# Altium footprint library mastermind.PCBLIB: 1061 footprints (part 43 of 67)
Each footprint in its own frame and in the unit in brackets; x right, y up, seen from the top. Pads: shape width x height; smd on the part's side, far side on the other; paste and mask are expansions set on the pad; w line width, h text height; cw(c..) or ccw(c..) is an arc to the next point about the centre after c.
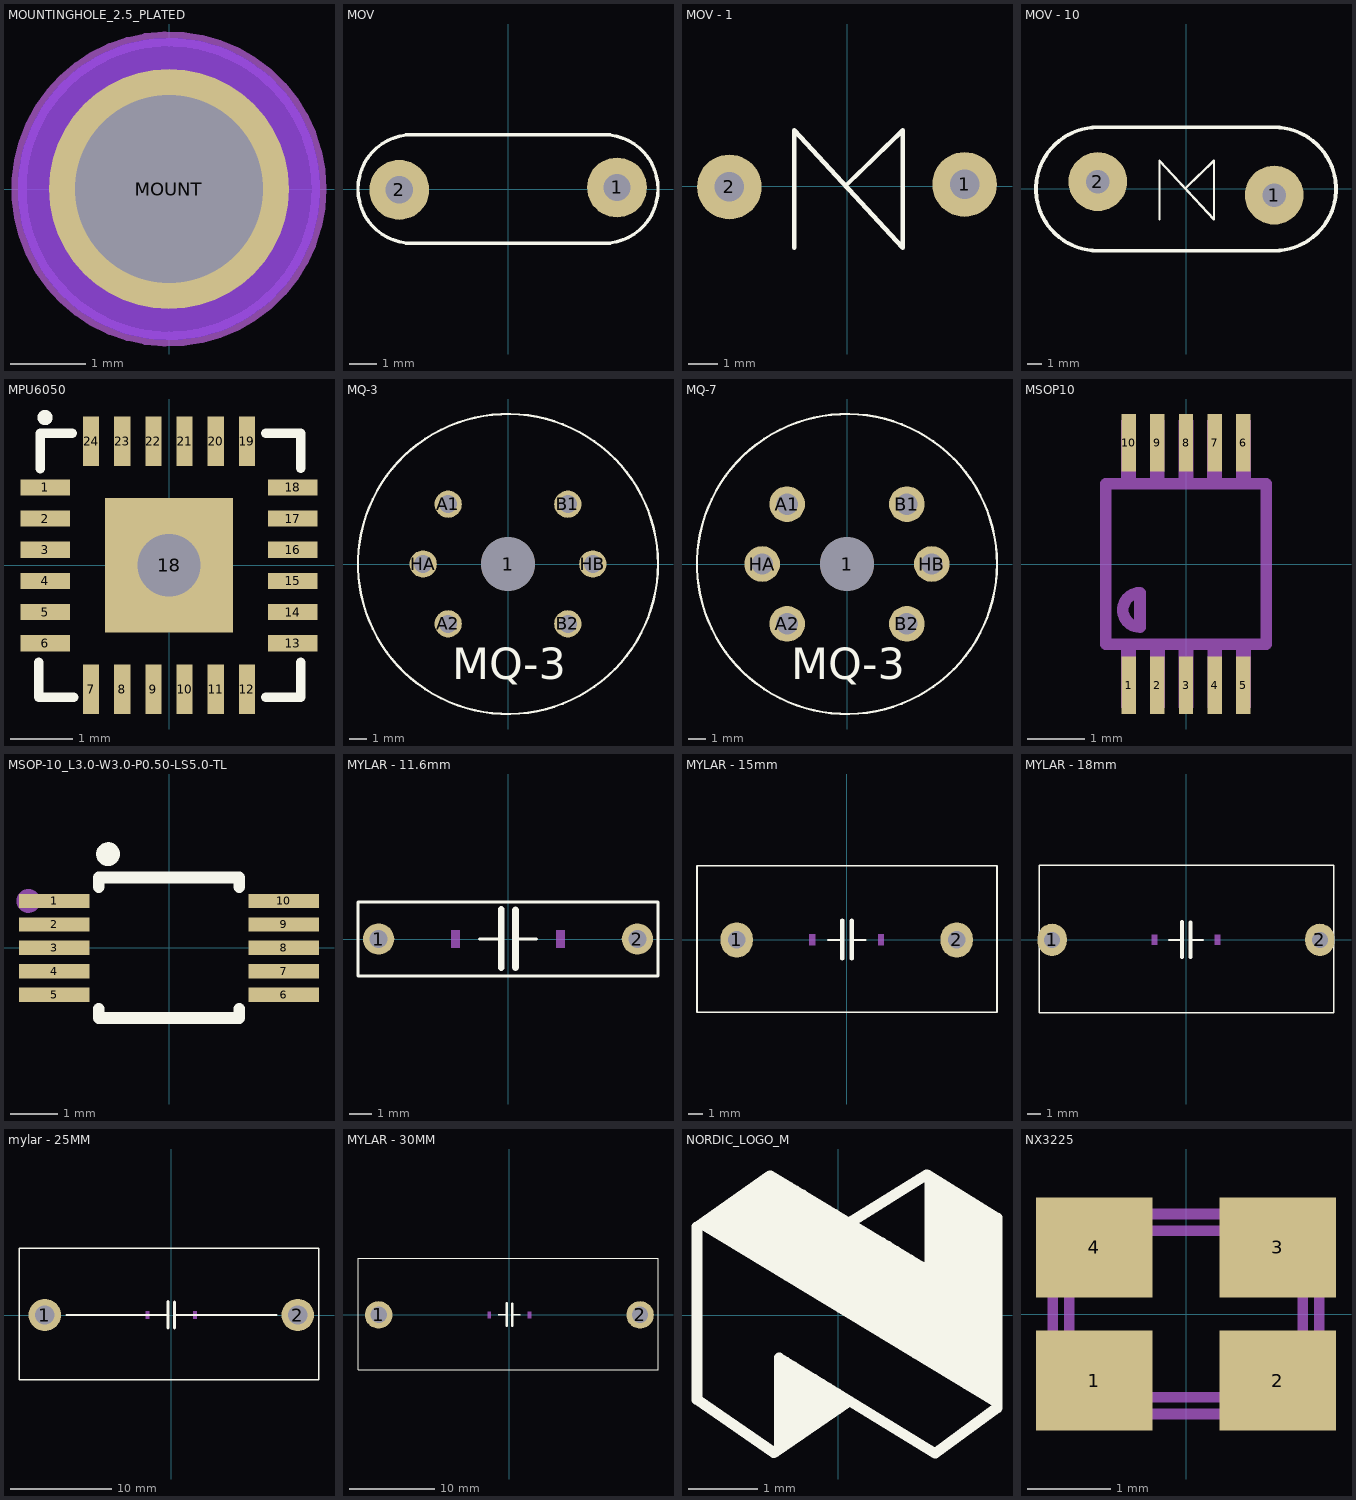
[diagram p42: the footprints below, top view; thin cyan lines are the x and y axes]

## MOUNTINGHOLE_2.5_PLATED [mm] "MOUNTINGHOLE_2.5_PLATED"
pads (1):
  round 3.2 hole 2.5: MOUNT(0,0)
Top Layer keep-out:
  circle w2.032: c0,0 r1
  circle w2.032: c0,0 r1
Bottom Layer keep-out:
  circle w2.032: c0,0 r1
  circle w2.032: c0,0 r1
Dimensions:
  circle w0.203: c0,0 r2

## MOV [mm] "VARISTOR"
pads (2):
  round 2.2 hole 1: 1(4,0.056) 2(-4,-0.03)
Top Overlay:
  lines w0.127: -3.518,-2 cw(c-3.518,0) -3.518,2 3.505,2 cw(c3.505,0) 3.505,-2 -3.518,-2
3D body "User Library-Disc_CAP d6x3_5_5mm.step": height 8.1, standoff -2.02, extent -3,-0.999 3,1.101

## MOV - 1 [mm] "VARISTOR"
pads (2):
  round 2.2 hole 1: 1(4,0.056) 2(-4,-0.03)
Top Overlay:
  lines w0.152: -1.8,-2.1 -1.8,1.9 1.9,-2.1 1.9,1.9 0,0.051
3D body "User Library-Disc_CAP d6x3_5_5mm.step": height 8.1, standoff -2.02, extent -3,-0.999 3,1.101

## MOV - 10 [mm] "VARISTOR"
pads (2):
  round 4 hole 1.6: 1(6,-0.444) 2(-6,0.47)
Top Overlay:
  lines w0.152: -1.8,-2.1 -1.8,1.9 1.9,-2.1 1.9,1.9 0,0.051
  lines w0.254: 5.914,-4.23 -6,-4.23 cw(c-6,-0.03) -6,4.17 5.914,4.17 ; 6,-4.23 ccw(c6,-0.03) 6,4.17
3D body "Fusion001.sldprt": height 27.5, standoff 3, extent -10.987,-2.85 10.505,2.95

## MPU6050 [mil]
pads (25):
  rect 31.1x10.2 smd: 1(-78,49) 2(-78,29.4) 3(-78,9.8) 4(-78,-9.8) 5(-78,-29.4) 6(-78,-49) 13(78,-49) 14(78,-29.4) 15(78,-9.8) 16(78,9.8) 17(78,29.4) 18(78,49)
  rect 10.2x31.1 smd: 7(-49,-78) 8(-29.4,-78) 9(-9.8,-78) 10(9.8,-78) 11(29.4,-78) 12(49,-78) 19(49,78) 20(29.4,78) 21(9.8,78) 22(-9.8,78) 23(-29.4,78) 24(-49,78)
  rect 80.7x84.6 / inner rect 80.7x84.6 / far side rect 0x0 hole 39.37: 18(0,0)
Top Overlay:
  circle w5: c-78,93 r2.24
  lines w5.98: -82,-61 -82,-83 -60,-83 ; -81,60.84 -81,83 -60.95,83 ; 61,-83 83,-83 83,-61 ; 61,83 83,83 83,61

## MQ-3 [mil]
pads (7):
  round 118.11 hole 118.11 unplated: 1(0,0)
  round 60 hole 40: A1(-131.89,131.89) A2(-131.89,-131.89) B1(131.89,131.89) B2(131.89,-131.89) HA(-187.01,0) HB(187.01,0)
Top Overlay:
  circle w5: c0,0 r330.71
  text "MQ-3" at -122.5,-277.5 h118.11
3D body "MQ_GasSensor.STEP": height 590.55, standoff -275.59, extent -433.92,-430.01 423.92,427.83

## MQ-7 [mm]
pads (7):
  round 3 hole 3 unplated: 1(0,0)
  round 2 / inner round 1.524 / far side round 1.524 hole 1.2: A1(-3.35,3.35) A2(-3.35,-3.35) B1(3.35,3.35) B2(3.35,-3.35) HA(-4.75,0) HB(4.75,0)
Top Overlay:
  circle w0.127: c0,0 r8.4
  text "MQ-3" at -3.111,-7.048 h3
3D body "TGS822.STEP": height 10, standoff -8, extent -8.5,-8.5 8.5,8.5

## MSOP10 [mm]
pads (10):
  rect 0.25x1 smd: 1(-1,-2.113) 2(-0.5,-2.113) 3(0,-2.113) 4(0.5,-2.113) 5(1,-2.113) 6(1,2.113) 7(0.5,2.113) 8(0,2.113) 9(-0.5,2.113) 10(-1,2.113)
Mechanical 2:
  lines w0.203: -1.4,-1.4 1.4,-1.4 1.4,1.4 -1.4,1.4 -1.4,-1.4 ; -0.8,-1.1 cw(c-0.8,-0.8) -0.8,-0.5 -0.8,-1.1
Mechanical 8:
  region: -1.124,-2.5 -1.124,-1.5 -0.875,-1.5 -0.875,-2.5
  region: -0.624,-2.5 -0.624,-1.5 -0.374,-1.5 -0.374,-2.5
  region: -0.124,-2.5 -0.124,-1.5 0.125,-1.5 0.125,-2.5
  region: 0.376,-2.5 0.376,-1.5 0.626,-1.5 0.626,-2.5
  region: 0.876,-2.5 0.876,-1.5 1.126,-1.5 1.126,-2.5
  region: 1.124,2.5 1.124,1.5 0.875,1.5 0.875,2.5
  region: 0.624,2.5 0.624,1.5 0.374,1.5 0.374,2.5
  region: 0.124,2.5 0.124,1.5 -0.125,1.5 -0.125,2.5
  region: -0.376,2.5 -0.376,1.5 -0.626,1.5 -0.626,2.5
  region: -0.876,2.5 -0.876,1.5 -1.126,1.5 -1.126,2.5

## MSOP-10_L3.0-W3.0-P0.50-LS5.0-TL [mil]
pads (10):
  rect 59.05x12 smd paste+0 mask+2: 1(-96.5,39.37) 2(-96.5,19.68) 3(-96.5,0) 4(-96.5,-19.69) 5(-96.5,-39.37) 6(96.5,-39.37) 7(96.5,-19.69) 8(96.5,0) 9(96.5,19.68) 10(96.5,39.37)
Top Overlay:
  circle w10: c-51.18,78.74 r5
  lines w10: -59.05,-51.19 -59.05,-59.05 59.05,-59.05 59.05,-51.19 ; -59.05,51.19 -59.05,59 59.05,59 59.05,51.19
Mechanical 15:
  circle w10: c-118.11,39.37 r5
3D body "ADS1115IDGST.STEP": height 37.9, standoff -5.41, extent -96.32,-59.27 96.59,58.84

## MYLAR - 11.6mm [mm]
pads (2):
  round 1.4 hole 0.813: 1(-5.78,0) 2(5.78,0)
Top Overlay:
  lines w0.127: -6.7,-1.651 -6.7,1.651 6.7,1.651 6.7,-1.651 -6.7,-1.651
  lines w0.152: -1.27,0 -0.305,0 ; 0.33,0 1.27,0
  lines w0.305: -0.305,-1.27 -0.305,0 -0.305,1.321 ; 0.33,-1.27 0.33,0 0.33,1.295
Mechanical 8:
  region: -2.54,-0.381 -2.54,0.381 -2.159,0.381 -2.159,-0.381
  region: 2.159,-0.381 2.159,0.381 2.54,0.381 2.54,-0.381
3D body "CAP-104-600V.STEP": height 9.7, standoff -3.4, extent -6.529,-1.205 6.5,1.295

## MYLAR - 15mm [mm]
pads (2):
  oval 2.2x2.4 hole 1.2: 1(-7.5,0) 2(7.5,0)
Top Overlay:
  lines w0.127: -10.21,-4.94 -10.21,5.06 10.25,5.06 10.25,-4.94 -10.21,-4.94
  lines w0.152: -1.27,0 -0.305,0 ; 0.33,0 1.27,0
  lines w0.305: -0.305,-1.27 -0.305,0 -0.305,1.321 ; 0.33,-1.27 0.33,0 0.33,1.295
Mechanical 8:
  region: -2.54,-0.381 -2.54,0.381 -2.159,0.381 -2.159,-0.381
  region: 2.159,-0.381 2.159,0.381 2.54,0.381 2.54,-0.381
3D body "FILM_P15L19W6H14.step": height 14, standoff -6.2, extent -9.5,-2.9 9.5,3.1

## MYLAR - 18mm [mm]
pads (2):
  oval 2.2x2.4 hole 1.2: 1(-10,0) 2(10,0)
Top Overlay:
  lines w0.127: -10.96,-5.44 11.04,-5.44 11.04,5.56 -10.96,5.56 -10.96,-5.44
  lines w0.152: -1.27,0 -0.305,0 ; 0.33,0 1.27,0
  lines w0.305: -0.305,-1.27 -0.305,0 -0.305,1.321 ; 0.33,-1.27 0.33,0 0.33,1.295
Mechanical 8:
  region: 2.159,-0.381 2.159,0.381 2.54,0.381 2.54,-0.381
  region: -2.54,-0.381 -2.54,0.381 -2.159,0.381 -2.159,-0.381
3D body "CAP-104-600V.STEP": height 9.7, standoff -3.4, extent -6.529,-1.205 6.5,1.295

## mylar - 25MM [mm]
pads (2):
  round 3.2 hole 1.9: 1(-12.5,0) 2(12.5,0)
Top Overlay:
  lines w0.127: -15.049,-6.4 -15.049,6.6 14.6,6.6 14.6,-6.4 -15.049,-6.4
  lines w0.152: -10.386,0 -0.305,0 ; 0.33,0 10.444,0
  lines w0.305: -0.305,-1.27 -0.305,0 -0.305,1.321 ; 0.33,-1.27 0.33,0 0.33,1.295
Mechanical 2:
  text "String" at -2.446,10.162 h1.52
Mechanical 8:
  region: -2.54,-0.381 -2.54,0.381 -2.159,0.381 -2.159,-0.381
  region: 2.159,-0.381 2.159,0.381 2.54,0.381 2.54,-0.381
3D body "MKPH 0.3uf.stp": height 25, standoff -5, extent -14.9,-6.9 14.4,7.1

## MYLAR - 30MM [mm]
pads (2):
  round 3.2 hole 1.9: 1(-15.25,0) 2(15.25,0)
Top Overlay:
  lines w0.127: -17.66,-6.4 17.34,-6.4 17.34,6.6 -17.66,6.6 -17.66,-6.4
  lines w0.152: -1.27,0 -0.305,0 ; 0.33,0 1.27,0
  lines w0.305: -0.305,-1.27 -0.305,0 -0.305,1.321 ; 0.33,-1.27 0.33,0 0.33,1.295
Mechanical 2:
  text "String" at -2.446,10.162 h1.52
Mechanical 8:
  region: 2.159,-0.381 2.159,0.381 2.54,0.381 2.54,-0.381
  region: -2.54,-0.381 -2.54,0.381 -2.159,0.381 -2.159,-0.381
3D body: height 23.5, standoff 0, extent -17.66,-6.4 17.055,6.6

## NORDIC_LOGO_M [mm]
Top Overlay:
  lines w0.152: -1.94,1.3 2.276,-1.25 ; -1.857,1.25 -0.876,1.93 ; -1.768,1.203 -0.788,1.891 ; -1.683,1.147 -0.697,1.839 ; -1.602,1.098 -0.615,1.79 ; -1.502,1.036 -0.515,1.729 ; -1.399,0.979 -0.417,1.668 ; -1.32,0.925 -0.332,1.619 ; -1.223,0.868 -0.237,1.56 ; -1.136,0.825 -0.157,1.512 ; -1.039,0.759 -0.055,1.449 ; -0.937,0.696 0.05,1.389 ; -0.93,-1.97 -2.03,-1.209 -2.03,1.27 -0.98,2.007 1.26,0.66 0.254,-0.025 ; -0.9,-1.956 0.16,-1.23 ; -0.85,-1.915 -0.85,-0.61 1.39,-1.98 2.276,-1.33 ; -0.832,0.633 0.17,1.336 ; -0.76,-1.85 -0.76,-0.668 ; -0.734,0.572 0.253,1.265 ; -0.64,-1.77 -0.64,-0.74 ; -0.638,0.517 0.343,1.205 ; -0.545,-1.71 -0.545,-0.8 ; -0.54,0.46 0.441,1.149 ; -0.461,0.411 0.523,1.102 ; -0.447,-1.64 -0.447,-0.86 ; -0.357,0.346 0.63,1.039 ; -0.35,-1.579 -0.35,-0.92 ; -0.274,0.295 0.714,0.988 ; -0.23,-1.497 -0.23,-0.99 ; -0.157,0.226 0.829,0.919 ; -0.14,-1.435 -0.14,-1.044 ; -0.052,0.163 0.933,0.855 ; -0.01,-1.346 -0.01,-1.124 ; 0.048,0.103 1.033,0.795 ; 0.138,0.044 1.144,0.711 ; 0.16,1.33 1.27,2.02 2.276,1.4 ; 0.22,-0.006 1.2,0.696 ; 0.305,-0.051 1.312,0.673 2.276,0.08 ; 0.426,-0.125 1.42,0.573 ; 0.534,-0.185 1.524,0.51 ; 0.635,-0.253 1.63,0.446 ; 0.741,-0.322 1.74,0.379 ; 0.836,-0.374 1.83,0.324 ; 0.932,-0.423 1.92,0.27 ; 1,-0.47 1.985,0.23 ; 1.103,-0.54 2.1,0.16 ; 1.238,-0.618 2.232,0.08 ; 1.31,1.99 1.31,0.73 ; 1.312,0.723 2.276,0.13 ; 1.312,0.853 2.276,0.26 ; 1.312,0.943 2.276,0.35 ; 1.312,1.073 2.276,0.48 ; 1.312,1.193 2.276,0.6 ; 1.312,1.273 2.276,0.68 ; 1.312,1.413 2.276,0.82 ; 1.312,1.533 2.276,0.94 ; 1.312,1.653 2.276,1.06 ; 1.312,1.743 2.276,1.15 ; 1.312,1.883 2.276,1.29 ; 1.325,-0.671 2.276,0.008 ; 1.435,-0.738 2.276,-0.136 ; 1.549,-0.809 2.276,-0.287 ; 1.645,-0.865 2.276,-0.411 ; 1.733,-0.916 2.276,-0.527 ; 1.829,-0.978 2.276,-0.651 ; 1.911,-1.028 2.276,-0.759 ; 2.025,-1.095 2.276,-0.908 ; 2.144,-1.166 2.276,-1.062 ; 2.276,-1.32 2.276,1.396

## NX3225 [mil]
pads (4):
  rect 55.12x47.24 smd: 1(-43.31,-31.5) 2(43.31,-31.5) 3(43.31,31.5) 4(-43.31,31.5)
Mechanical 2:
  lines w5: -62.99,-47.24 62.99,-47.24 62.99,47.24 -62.99,47.24 -62.99,-47.24 ; -55.12,-26.87 ccw(c-42.62,-26.87) -42.62,-39.37 42.62,-39.37 ccw(c42.62,-26.87) 55.12,-26.87 55.12,26.87 ccw(c42.62,26.87) 42.62,39.37 -42.62,39.37 ccw(c-42.62,26.87) -55.12,26.87 -55.12,-26.87